# Altium footprint library Components.PcbLib: 68 footprints (part 4 of 5)
Each footprint in its own frame and in the unit in brackets; x right, y up, seen from the top. Pads: shape width x height; smd on the part's side, far side on the other; paste and mask are expansions set on the pad; w line width, h text height; cw(c..) or ccw(c..) is an arc to the next point about the centre after c.
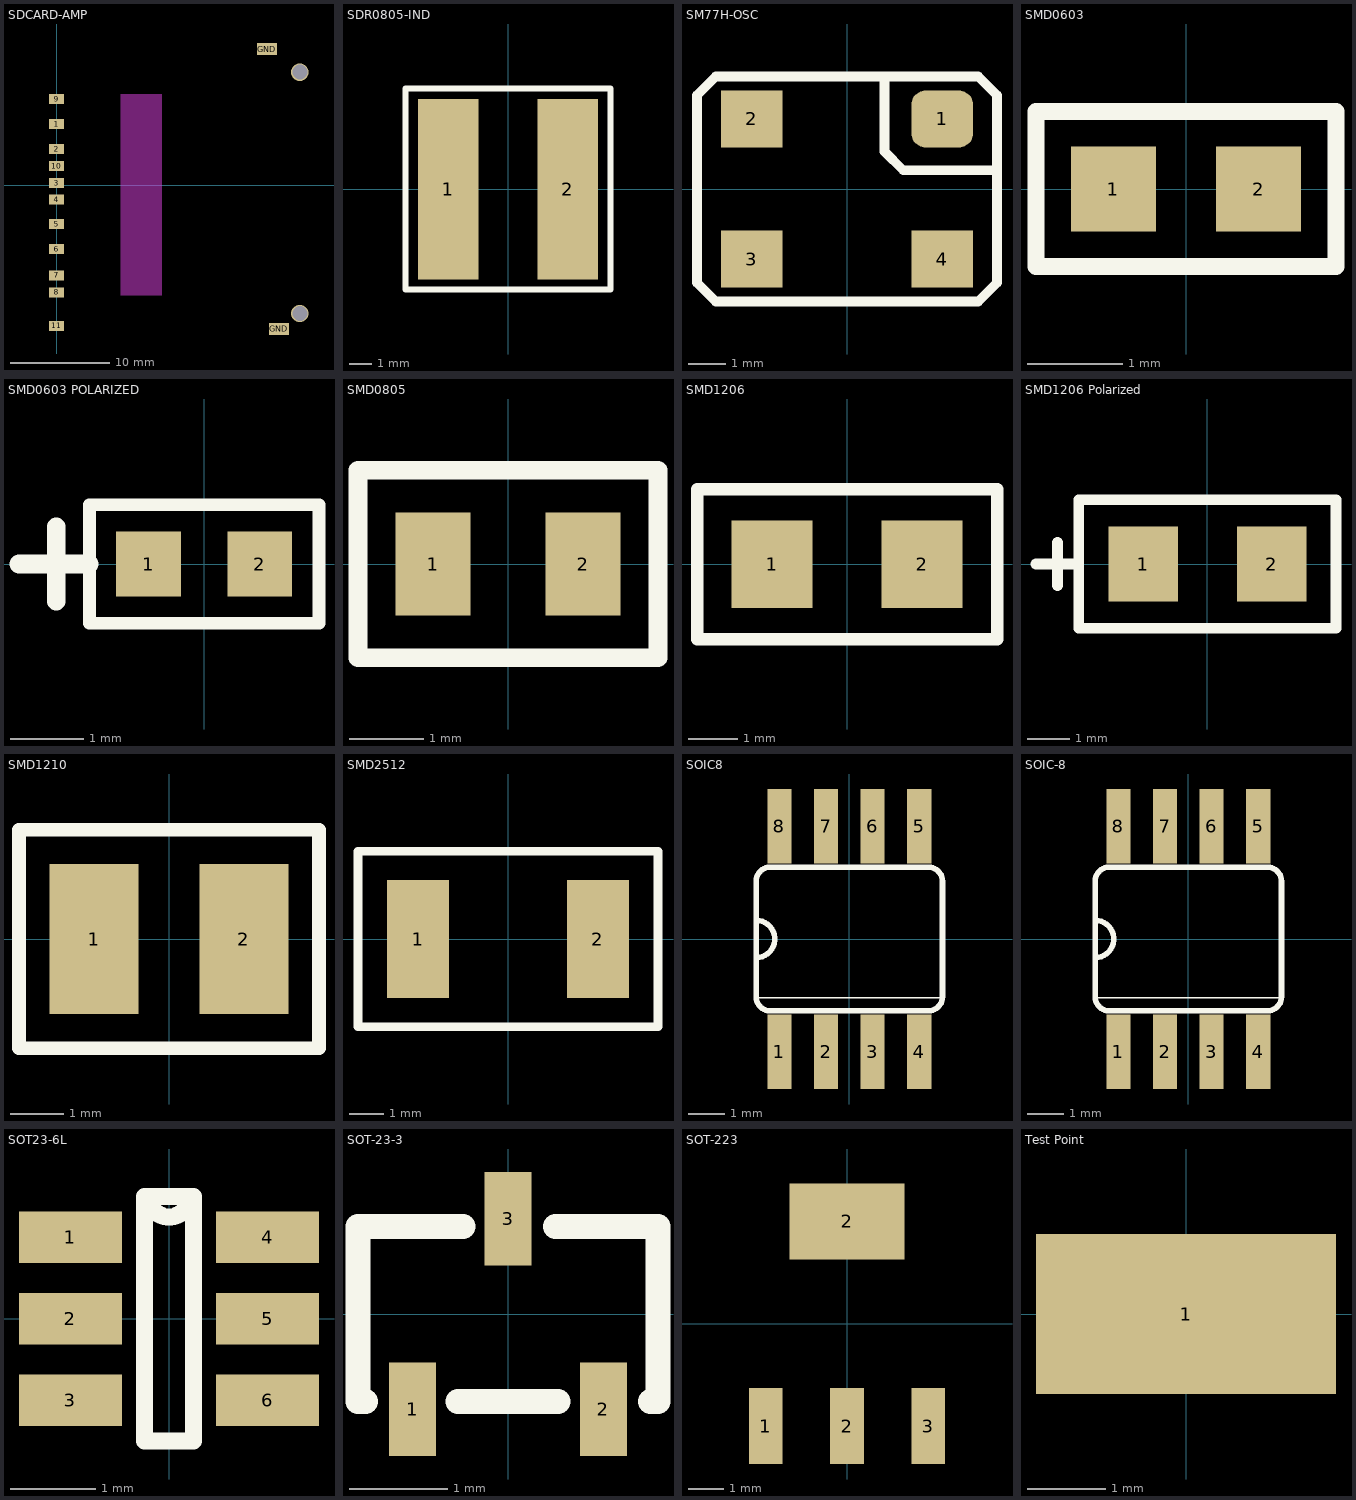
[diagram p3: the footprints below, top view; thin cyan lines are the x and y axes]

## SDCARD-AMP [mm] "Amphenol 101003136802"
pads (13):
  rect 1.5x1 smd: 1(0,6.1) 2(0,3.6) 3(0,0.2) 4(0,-1.45) 5(0,-3.9) 6(0,-6.4) 7(0,-9.03) 8(0,-10.73) 9(0,8.6) 10(0,1.9) 11(0,-14.08)
  rect 2x1.2 smd: GND(21.01,13.6) GND(22.21,-14.4)
via 24.31,-12.85 diameter 1.75 hole 1.5
via 24.31,11.3 diameter 1.75 hole 1.5
Keep-Out Layer:
  region: 6.4,9.1 10.51,9.1 10.51,-11.03 6.4,-11.03
3D body: height 2.7, standoff 0, extent 0,-14.45 28.9,14.45

## SDR0805-IND [mm]
pads (2):
  rect 2.7x8 smd: 1(-2.65,0) 2(2.65,0)
Top Overlay:
  lines w0.254: -4.547,-4.445 -4.547,4.47 4.547,4.47 4.547,-4.445 -4.547,-4.445
3D body: height 5.3, standoff 0, extent -3.9,-3.9 3.9,3.9

## SM77H-OSC [mil]
pads (4):
  rrect50% 65x60 smd: 1(100,73.5)
  rect 65x60 smd: 2(-100,73.5) 3(-100,-73.5) 4(100,-73.5)
Top Overlay:
  lines w10: 39.37,118.11 39.37,39.37 59.06,19.68 157.48,19.68 ; -157.48,-98.43 -157.48,98.43 -137.8,118.11 137.8,118.11 157.48,98.43 157.48,-98.43 137.8,-118.11 -137.8,-118.11 -157.48,-98.43

## SMD0603 [mil]
pads (2):
  rect 35x35 smd: 1(-30,0) 2(30,0)
Top Overlay:
  lines w7: -62,-32 -62,2 -62,32 62,32 62,-32 -62,-32
3D body: height 17.72, standoff 0, extent -31.49,-15.75 31.5,15.76

## SMD0603 POLARIZED [mil]
pads (2):
  rect 35x35 smd: 1(-30,0) 2(30,0)
Top Overlay:
  lines w7: -62,0 -62,32 62,32 62,-32 -62,-32 -62,2
  lines w10: -100,0 -62,0 ; -80,-20 -80,20
3D body: height 17.72, standoff 0, extent -31.49,-15.75 31.5,15.76

## SMD0805 [mil]
pads (2):
  rect 40x55 smd: 1(-40,0) 2(40,0)
Top Overlay:
  lines w10: -80,-50 80,-50 80,50 -80,50 -80,-7.5 -80,-50
3D body: height 19.68, standoff 0, extent -39.36,-24.8 39.38,24.42

## SMD1206 [mil]
pads (2):
  rect 65x70 smd: 1(-60,0) 2(60,0)
Top Overlay:
  lines w10: -120,-60 -120,60 120,60 120,-60 -120,-60
3D body: height 21.65, standoff 0, extent -61.02,-30.39 61.03,30.71

## SMD1206 Polarized [mil]
pads (2):
  rect 65x70 smd: 1(-60,0) 2(60,0)
Top Overlay:
  lines w10: -160,0 -120,0 ; -140,-20 -140,20 ; -120,-60 120,-60 120,60 -120,60 -120,-60
3D body: height 70.87, standoff 0, extent -66.92,-35.43 66.93,35.44

## SMD1210 [mil]
pads (2):
  rect 65x110 smd: 1(-55,0) 2(55,0)
Top Overlay:
  lines w10: -110,-80 -110,57.5 -110,80 110,80 110,-80 -110,-80
3D body: height 70.87, standoff 0, extent -68.89,-53.14 68.9,53.16

## SMD2512 [mm]
pads (2):
  rect 1.8x3.4 smd: 1(-2.6,0) 2(2.6,0)
Top Overlay:
  lines w0.254: -4.34,-2.54 -4.34,0 -4.34,2.54 4.34,2.54 4.34,-2.54 -4.34,-2.54
3D body: height 0.81, standoff 0, extent -3.175,-1.6 3.175,1.575

## SOIC8 [mil]
pads (8):
  rect 26x80 smd mask+3: 1(-75,-121) 2(-25,-121) 3(25,-121) 4(75,-121) 5(75,121) 6(25,121) 7(-25,121) 8(-75,121)
Top Overlay:
  lines w2: -100,-63 100,-63
  lines w6: -100,-20 ccw(c-100,0) -100,20 ; -100,-20 -100,-62 ccw(c-85,-62) -85,-77 85,-77 ccw(c85,-62) 100,-62 100,62 ccw(c85,62) 85,77 -85,77 ccw(c-85,62) -100,62 -100,20 ; -100,-20 -100,20
3D body: height 68.9, standoff 0, extent -96.46,-118.11 96.45,118.11

## SOIC-8 [mil]
pads (8):
  rect 26x80 smd mask+3: 1(-75,-121) 2(-25,-121) 3(25,-121) 4(75,-121) 5(75,121) 6(25,121) 7(-25,121) 8(-75,121)
Top Overlay:
  lines w2: -100,-63 100,-63
  lines w6: -100,-20 ccw(c-100,0) -100,20 ; -100,-20 -100,-62 ccw(c-85,-62) -85,-77 85,-77 ccw(c85,-62) 100,-62 100,62 ccw(c85,62) 85,77 -85,77 ccw(c-85,62) -100,62 -100,20 ; -100,-20 -100,20
3D body: height 68.9, standoff 0, extent -96.46,-118.11 96.45,118.11

## SOT23-6L [mm] "ESDA6V1BC6"
pads (6):
  rect 1.2x0.6 smd: 1(-1.15,0.95) 2(-1.15,0) 3(-1.15,-0.95) 4(1.15,0.95) 5(1.15,0) 6(1.15,-0.95)
Top Overlay:
  lines w0.2: -0.285,-1.425 -0.285,1.425 0.238,1.425 cw(c0,1.425) -0.238,1.425 0.285,1.425 0.285,-1.425 -0.285,-1.425
3D body: height 1.45, standoff 0.1, extent -0.875,-1.525 0.875,1.525

## SOT-23-3 [mm] "ESDCAN24-2BLY"
height 1.499
pads (3):
  rect 0.48x0.95 smd mask+0.076: 1(-0.97,-0.97) 2(0.97,-0.97) 3(0,0.97)
Top Overlay:
  lines w0.254: -1.448,-0.889 -1.524,-0.889 -1.524,0.889 -0.457,0.889 ; -0.508,-0.889 0.508,-0.889 ; 0.483,0.889 1.524,0.889 1.524,-0.889 1.448,-0.889
3D body: height 1.5, standoff 0.1, extent -1.52,-0.875 1.52,0.875

## SOT-223 [mm]
pads (4):
  rect 0.95x2.15 smd mask+0.076: 1(-2.3,-2.9) 2(0,-2.9) 3(2.3,-2.9)
  rect 3.25x2.15 smd mask+0.076: 2(0,2.9)
3D body: height 1.8, standoff 0, extent -3.35,-3.65 3.35,3.65

## Test Point [mil]
pads (1):
  rect 150x80 smd: 1(0,0)
3D body: height 90, standoff 1, extent -75,-30 75,30